# Altium footprint library LukaLIBRARY.PcbLib: 784 footprints (part 44 of 49)
Each footprint in its own frame and in the unit in brackets; x right, y up, seen from the top. Pads: shape width x height; smd on the part's side, far side on the other; paste and mask are expansions set on the pad; w line width, h text height; cw(c..) or ccw(c..) is an arc to the next point about the centre after c.
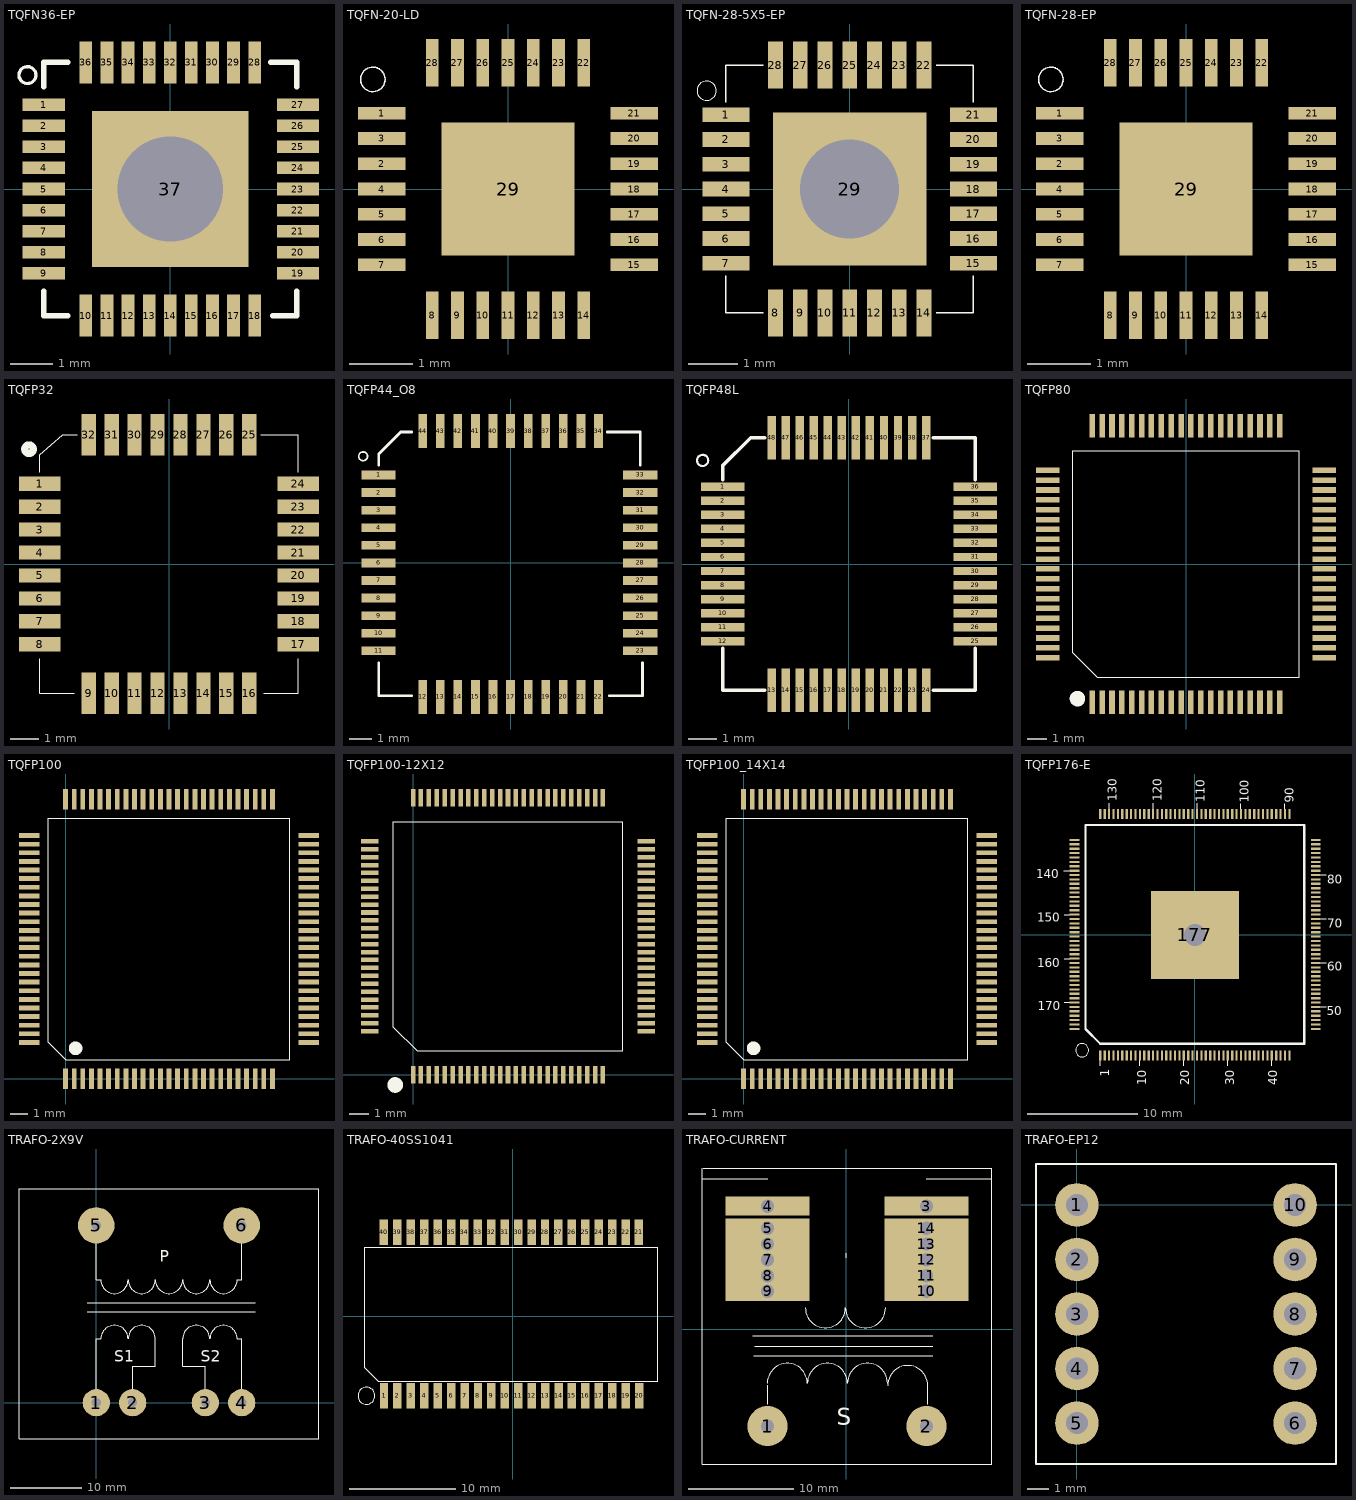
[diagram p43: the footprints below, top view; thin cyan lines are the x and y axes]

## TQFN36-EP [mm]
pads (37):
  rect 1x0.3 smd mask-25.4: 1(-3,2) 2(-3,1.5) 3(-3,1) 4(-3,0.5) 5(-3,0) 6(-3,-0.5) 7(-3,-1) 8(-3,-1.5) 9(-3,-2) 19(3.025,-2) 20(3.025,-1.5) 21(3.025,-1) 22(3.025,-0.5) 23(3.025,0) 24(3.025,0.5) 25(3.025,1) 26(3.025,1.5) 27(3.025,2)
  rect 0.3x1 smd mask-25.4: 10(-2,-3) 11(-1.5,-3) 12(-1,-3) 13(-0.5,-3) 14(0,-3) 15(0.5,-3) 16(1,-3) 17(1.5,-3) 18(2,-3) 28(2,3) 29(1.5,3) 30(1,3) 31(0.5,3) 32(0,3) 33(-0.5,3) 34(-1,3) 35(-1.5,3) 36(-2,3)
  rect 3.7x3.7 hole 2.5 unplated mask-25.4: 37(0,0)
Top Overlay:
  circle w0.076: c-3.385,2.7 r0.2
  lines w0.127: -3,-3 -2.425,-3 ; -3,-2.975 -3,-2.425 ; -3,2.425 -3,3 ; -2.975,3 -2.425,3 ; 2.375,3 3,3 ; 2.425,-3 2.975,-3 ; 3,-3 3,-2.425 ; 3,2.425 3,2.975
Top Solder:
  region: -1.85,-3.5 -1.85,-2.5 -2.15,-2.5 -2.15,-3.5
  region: -1.35,-3.5 -1.35,-2.5 -1.65,-2.5 -1.65,-3.5
  region: -0.85,-3.5 -0.85,-2.5 -1.15,-2.5 -1.15,-3.5
  region: -0.35,-3.5 -0.35,-2.5 -0.65,-2.5 -0.65,-3.5
  region: 0.15,-3.5 0.15,-2.5 -0.15,-2.5 -0.15,-3.5
  region: 0.65,-3.5 0.65,-2.5 0.35,-2.5 0.35,-3.5
  region: 1.15,-3.5 1.15,-2.5 0.85,-2.5 0.85,-3.5
  region: 1.65,-3.5 1.65,-2.5 1.35,-2.5 1.35,-3.5
  region: 2.15,-3.5 2.15,-2.5 1.85,-2.5 1.85,-3.5
  region: -3.5,0.35 -2.5,0.35 -2.5,0.65 -3.5,0.65
  region: -3.5,-0.15 -2.5,-0.15 -2.5,0.15 -3.5,0.15
  region: -3.5,-0.65 -2.5,-0.65 -2.5,-0.35 -3.5,-0.35
  region: -3.5,-1.15 -2.5,-1.15 -2.5,-0.85 -3.5,-0.85
  region: -3.5,-1.65 -2.5,-1.65 -2.5,-1.35 -3.5,-1.35
  region: -3.5,-2.15 -2.5,-2.15 -2.5,-1.85 -3.5,-1.85
  region: 1.15,2.5 1.15,3.5 0.85,3.5 0.85,2.5
  region: 0.65,2.5 0.65,3.5 0.35,3.5 0.35,2.5
  region: 0.15,2.5 0.15,3.5 -0.15,3.5 -0.15,2.5
  region: -0.35,2.5 -0.35,3.5 -0.65,3.5 -0.65,2.5
  region: -0.85,2.5 -0.85,3.5 -1.15,3.5 -1.15,2.5
  region: -1.35,2.5 -1.35,3.5 -1.65,3.5 -1.65,2.5
  region: -1.85,2.5 -1.85,3.5 -2.15,3.5 -2.15,2.5
  region: 1.65,2.5 1.65,3.5 1.35,3.5 1.35,2.5
  region: 2.15,2.5 2.15,3.5 1.85,3.5 1.85,2.5
  region: -3.5,1.35 -2.5,1.35 -2.5,1.65 -3.5,1.65
  region: -3.5,1.85 -2.5,1.85 -2.5,2.15 -3.5,2.15
  region: 1.85,-1.85 1.85,1.85 -1.85,1.85 -1.85,-1.85
  region: -3.5,0.85 -2.5,0.85 -2.5,1.15 -3.5,1.15
  region: 3.525,-1.35 2.525,-1.35 2.525,-1.65 3.525,-1.65
  region: 3.525,-0.85 2.525,-0.85 2.525,-1.15 3.525,-1.15
  region: 3.525,-0.35 2.525,-0.35 2.525,-0.65 3.525,-0.65
  region: 3.525,0.15 2.525,0.15 2.525,-0.15 3.525,-0.15
  region: 3.525,0.65 2.525,0.65 2.525,0.35 3.525,0.35
  region: 3.525,-1.85 2.525,-1.85 2.525,-2.15 3.525,-2.15
  region: 2.525,1.85 3.525,1.85 3.525,2.15 2.525,2.15
  region: 2.525,1.35 3.525,1.35 3.525,1.65 2.525,1.65
  region: 2.525,0.85 3.525,0.85 3.525,1.15 2.525,1.15
Bottom Solder:
  region: -1.859,0 -1.823,-0.363 -1.717,-0.711 -1.546,-1.033 -1.314,-1.314 -1.033,-1.546 -0.711,-1.717 -0.363,-1.823 0,-1.859 0.363,-1.823 0.711,-1.717 1.033,-1.546 1.314,-1.314 1.546,-1.033 1.717,-0.711 1.823,-0.363 1.859,0 1.823,0.363 1.717,0.711 1.546,1.033 1.314,1.314 1.033,1.546 0.711,1.717 0.363,1.823 0,1.859 -0.363,1.823 -0.711,1.717 -1.033,1.546 -1.314,1.314 -1.546,1.033 -1.717,0.711 -1.823,0.363

## TQFN-20-LD [mm]
pads (29):
  rect 0.75x0.2 smd mask-25.4: 1(-2,1.2) 2(-2,0.4) 3(-2,0.8) 4(-2,0) 5(-2,-0.4) 6(-2,-0.8) 7(-2,-1.2) 15(2,-1.2) 16(2,-0.8) 17(2,-0.4) 18(2,0) 19(2,0.4) 20(2,0.8) 21(2,1.2)
  rect 0.2x0.75 smd mask-25.4: 8(-1.2,-2) 9(-0.8,-2) 10(-0.4,-2) 11(0,-2) 12(0.4,-2) 13(0.8,-2) 14(1.2,-2) 22(1.2,2) 23(0.8,2) 24(0.4,2) 25(0,2) 26(-0.4,2) 27(-0.8,2) 28(-1.2,2)
  rect 2.1x2.1 smd mask-25.4: 29(0,0)
Top Overlay:
  circle w0.025: c-2.14,1.735 r0.194
Top Solder:
  region: -1.05,-1.05 1.05,-1.05 1.05,1.05 -1.05,1.05
  region: 2.375,-0.1 2.375,0.1 1.625,0.1 1.625,-0.1
  region: -1.625,-0.1 -1.625,0.1 -2.375,0.1 -2.375,-0.1
  region: -1.3,1.625 -1.1,1.625 -1.1,2.375 -1.3,2.375
  region: -0.9,1.625 -0.7,1.625 -0.7,2.375 -0.9,2.375
  region: -0.5,1.625 -0.3,1.625 -0.3,2.375 -0.5,2.375
  region: -0.1,1.625 0.1,1.625 0.1,2.375 -0.1,2.375
  region: 0.3,1.625 0.5,1.625 0.5,2.375 0.3,2.375
  region: 0.7,1.625 0.9,1.625 0.9,2.375 0.7,2.375
  region: 1.1,1.625 1.3,1.625 1.3,2.375 1.1,2.375
  region: 2.375,1.1 2.375,1.3 1.625,1.3 1.625,1.1
  region: 2.375,0.7 2.375,0.9 1.625,0.9 1.625,0.7
  region: 2.375,0.3 2.375,0.5 1.625,0.5 1.625,0.3
  region: -1.625,1.1 -1.625,1.3 -2.375,1.3 -2.375,1.1
  region: -1.625,0.7 -1.625,0.9 -2.375,0.9 -2.375,0.7
  region: -1.625,0.3 -1.625,0.5 -2.375,0.5 -2.375,0.3
  region: 2.375,-0.5 2.375,-0.3 1.625,-0.3 1.625,-0.5
  region: 2.375,-0.9 2.375,-0.7 1.625,-0.7 1.625,-0.9
  region: 1.625,-1.1 1.625,-1.3 2.375,-1.3 2.375,-1.1
  region: 1.1,-2.375 1.3,-2.375 1.3,-1.625 1.1,-1.625
  region: 0.7,-2.375 0.9,-2.375 0.9,-1.625 0.7,-1.625
  region: 0.3,-2.375 0.5,-2.375 0.5,-1.625 0.3,-1.625
  region: -0.1,-2.375 0.1,-2.375 0.1,-1.625 -0.1,-1.625
  region: -0.5,-2.375 -0.3,-2.375 -0.3,-1.625 -0.5,-1.625
  region: -0.9,-2.375 -0.7,-2.375 -0.7,-1.625 -0.9,-1.625
  region: -1.3,-2.375 -1.1,-2.375 -1.1,-1.625 -1.3,-1.625
  region: -1.625,-1.3 -1.625,-1.1 -2.375,-1.1 -2.375,-1.3
  region: -2.375,-0.7 -2.375,-0.9 -1.625,-0.9 -1.625,-0.7
  region: -1.625,-0.5 -1.625,-0.3 -2.375,-0.3 -2.375,-0.5

## TQFN-28-5X5-EP [mm]
pads (29):
  rect 0.95x0.3 smd mask-25.4: 1(-2.5,1.5) 2(-2.5,1) 3(-2.5,0.5) 4(-2.5,0) 5(-2.5,-0.5) 6(-2.5,-1) 7(-2.5,-1.5) 15(2.5,-1.5) 16(2.5,-1) 17(2.5,-0.5) 18(2.5,0) 19(2.5,0.5) 20(2.5,1) 21(2.5,1.5)
  rect 0.3x0.95 smd mask-25.4: 8(-1.5,-2.5) 9(-1,-2.5) 10(-0.5,-2.5) 11(0,-2.5) 12(0.5,-2.5) 13(1,-2.5) 14(1.5,-2.5) 22(1.5,2.5) 23(1,2.5) 24(0.5,2.5) 25(0,2.5) 26(-0.5,2.5) 27(-1,2.5) 28(-1.5,2.5)
  rect 3.1x3.1 hole 2 unplated mask-25.4: 29(0,0)
Top Overlay:
  circle w0.025: c-2.89,1.985 r0.194
  lines w0.03: -2.5,-1.75 -2.5,-2.5 -1.75,-2.5 ; -2.5,1.75 -2.5,2.5 -1.75,2.5 ; 1.75,-2.5 2.5,-2.5 2.5,-1.75 ; 1.75,2.5 2.5,2.5 2.5,1.75
Top Solder:
  region: -1.55,-1.55 1.55,-1.55 1.55,1.55 -1.55,1.55
  region: -0.15,2.025 0.15,2.025 0.15,2.975 -0.15,2.975
  region: -0.15,-2.975 0.15,-2.975 0.15,-2.025 -0.15,-2.025
  region: 2.975,-0.15 2.975,0.15 2.025,0.15 2.025,-0.15
  region: -2.025,-0.15 -2.025,0.15 -2.975,0.15 -2.975,-0.15
  region: 2.975,0.35 2.975,0.65 2.025,0.65 2.025,0.35
  region: 2.975,1.35 2.975,1.65 2.025,1.65 2.025,1.35
  region: 2.975,0.85 2.975,1.15 2.025,1.15 2.025,0.85
  region: 0.35,2.025 0.65,2.025 0.65,2.975 0.35,2.975
  region: 0.85,2.025 1.15,2.025 1.15,2.975 0.85,2.975
  region: 1.35,2.025 1.65,2.025 1.65,2.975 1.35,2.975
  region: 2.975,-0.65 2.975,-0.35 2.025,-0.35 2.025,-0.65
  region: 2.975,-1.15 2.975,-0.85 2.025,-0.85 2.025,-1.15
  region: 2.025,-1.35 2.025,-1.65 2.975,-1.65 2.975,-1.35
  region: 0.35,-2.975 0.65,-2.975 0.65,-2.025 0.35,-2.025
  region: 1.35,-2.975 1.65,-2.975 1.65,-2.025 1.35,-2.025
  region: 0.85,-2.975 1.15,-2.975 1.15,-2.025 0.85,-2.025
  region: -2.025,0.85 -2.025,1.15 -2.975,1.15 -2.975,0.85
  region: -2.025,0.35 -2.025,0.65 -2.975,0.65 -2.975,0.35
  region: -2.025,1.35 -2.025,1.65 -2.975,1.65 -2.975,1.35
  region: -1.65,2.025 -1.35,2.025 -1.35,2.975 -1.65,2.975
  region: -1.15,2.025 -0.85,2.025 -0.85,2.975 -1.15,2.975
  region: -0.65,2.025 -0.35,2.025 -0.35,2.975 -0.65,2.975
  region: -2.025,-1.65 -2.025,-1.35 -2.975,-1.35 -2.975,-1.65
  region: -2.975,-0.85 -2.975,-1.15 -2.025,-1.15 -2.025,-0.85
  region: -2.025,-0.65 -2.025,-0.35 -2.975,-0.35 -2.975,-0.65
  region: -0.65,-2.975 -0.35,-2.975 -0.35,-2.025 -0.65,-2.025
  region: -1.15,-2.975 -0.85,-2.975 -0.85,-2.025 -1.15,-2.025
  region: -1.65,-2.975 -1.35,-2.975 -1.35,-2.025 -1.65,-2.025
Bottom Solder:
  region: 0,1.507 -0.294,1.478 -0.577,1.393 -0.837,1.253 -1.066,1.066 -1.253,0.837 -1.393,0.577 -1.478,0.294 -1.507,0 -1.478,-0.294 -1.393,-0.577 -1.253,-0.837 -1.066,-1.066 -0.837,-1.253 -0.577,-1.393 -0.294,-1.478 0,-1.507 0.294,-1.478 0.577,-1.393 0.837,-1.253 1.066,-1.066 1.253,-0.837 1.393,-0.577 1.478,-0.294 1.507,0 1.478,0.294 1.393,0.577 1.253,0.837 1.066,1.066 0.837,1.253 0.577,1.393 0.294,1.478

## TQFN-28-EP [mm]
pads (29):
  rect 0.75x0.2 smd mask-25.4: 1(-2,1.2) 2(-2,0.4) 3(-2,0.8) 4(-2,0) 5(-2,-0.4) 6(-2,-0.8) 7(-2,-1.2) 15(2,-1.2) 16(2,-0.8) 17(2,-0.4) 18(2,0) 19(2,0.4) 20(2,0.8) 21(2,1.2)
  rect 0.2x0.75 smd mask-25.4: 8(-1.2,-2) 9(-0.8,-2) 10(-0.4,-2) 11(0,-2) 12(0.4,-2) 13(0.8,-2) 14(1.2,-2) 22(1.2,2) 23(0.8,2) 24(0.4,2) 25(0,2) 26(-0.4,2) 27(-0.8,2) 28(-1.2,2)
  rect 2.1x2.1 smd mask-25.4: 29(0,0)
Top Overlay:
  circle w0.025: c-2.14,1.735 r0.194
Top Solder:
  region: -1.625,-0.5 -1.625,-0.3 -2.375,-0.3 -2.375,-0.5
  region: -2.375,-0.7 -2.375,-0.9 -1.625,-0.9 -1.625,-0.7
  region: -1.625,-1.3 -1.625,-1.1 -2.375,-1.1 -2.375,-1.3
  region: -1.3,-2.375 -1.1,-2.375 -1.1,-1.625 -1.3,-1.625
  region: -0.9,-2.375 -0.7,-2.375 -0.7,-1.625 -0.9,-1.625
  region: -0.5,-2.375 -0.3,-2.375 -0.3,-1.625 -0.5,-1.625
  region: -0.1,-2.375 0.1,-2.375 0.1,-1.625 -0.1,-1.625
  region: 0.3,-2.375 0.5,-2.375 0.5,-1.625 0.3,-1.625
  region: 0.7,-2.375 0.9,-2.375 0.9,-1.625 0.7,-1.625
  region: 1.1,-2.375 1.3,-2.375 1.3,-1.625 1.1,-1.625
  region: 1.625,-1.1 1.625,-1.3 2.375,-1.3 2.375,-1.1
  region: 2.375,-0.9 2.375,-0.7 1.625,-0.7 1.625,-0.9
  region: 2.375,-0.5 2.375,-0.3 1.625,-0.3 1.625,-0.5
  region: -1.625,0.3 -1.625,0.5 -2.375,0.5 -2.375,0.3
  region: -1.625,0.7 -1.625,0.9 -2.375,0.9 -2.375,0.7
  region: -1.625,1.1 -1.625,1.3 -2.375,1.3 -2.375,1.1
  region: 2.375,0.3 2.375,0.5 1.625,0.5 1.625,0.3
  region: 2.375,0.7 2.375,0.9 1.625,0.9 1.625,0.7
  region: 2.375,1.1 2.375,1.3 1.625,1.3 1.625,1.1
  region: 1.1,1.625 1.3,1.625 1.3,2.375 1.1,2.375
  region: 0.7,1.625 0.9,1.625 0.9,2.375 0.7,2.375
  region: 0.3,1.625 0.5,1.625 0.5,2.375 0.3,2.375
  region: -0.1,1.625 0.1,1.625 0.1,2.375 -0.1,2.375
  region: -0.5,1.625 -0.3,1.625 -0.3,2.375 -0.5,2.375
  region: -0.9,1.625 -0.7,1.625 -0.7,2.375 -0.9,2.375
  region: -1.3,1.625 -1.1,1.625 -1.1,2.375 -1.3,2.375
  region: -1.625,-0.1 -1.625,0.1 -2.375,0.1 -2.375,-0.1
  region: 2.375,-0.1 2.375,0.1 1.625,0.1 1.625,-0.1
  region: -1.05,-1.05 1.05,-1.05 1.05,1.05 -1.05,1.05

## TQFP32 [mm]
pads (32):
  rect 1.45x0.5 smd: 1(-4.5,2.8) 2(-4.5,2) 3(-4.5,1.2) 4(-4.5,0.4) 5(-4.5,-0.4) 6(-4.5,-1.2) 7(-4.5,-2) 8(-4.5,-2.8) 17(4.5,-2.8) 18(4.5,-2) 19(4.5,-1.2) 20(4.5,-0.4) 21(4.5,0.4) 22(4.5,1.2) 23(4.5,2) 24(4.5,2.8)
  rect 0.5x1.45 smd: 9(-2.8,-4.5) 10(-2,-4.5) 11(-1.2,-4.5) 12(-0.4,-4.5) 13(0.4,-4.5) 14(1.2,-4.5) 15(2,-4.5) 16(2.8,-4.5) 25(2.8,4.5) 26(2,4.5) 27(1.2,4.5) 28(0.4,4.5) 29(-0.4,4.5) 30(-1.2,4.5) 31(-2,4.5) 32(-2.8,4.5)
Top Overlay:
  circle w0.25: c-4.875,4 r0.15
  lines w0.03: -4.5,-3.3 -4.5,-4.5 -3.3,-4.5 ; -4.5,3.2 -4.5,3.8 -3.7,4.5 -3.2,4.5 ; 3.2,4.5 4.5,4.5 4.5,3.2 ; 3.3,-4.5 4.5,-4.5 4.5,-3.3

## TQFP44_O8 [mm]
pads (44):
  rect 1.55x0.4 smd mask-25.4: 1(-6,4) 2(-6,3.2) 3(-6,2.4) 4(-6,1.6) 5(-6,0.8) 6(-6,0) 7(-6,-0.8) 8(-6,-1.6) 9(-6,-2.4) 10(-6,-3.2) 11(-6,-4) 23(5.9,-4) 24(5.9,-3.2) 25(5.9,-2.4) 26(5.9,-1.6) 27(5.9,-0.8) 28(5.9,0) 29(5.9,0.8) 30(5.9,1.6) 31(5.9,2.4) 32(5.9,3.2) 33(5.9,4)
  rect 0.4x1.55 smd mask-25.4: 12(-4,-6.1) 13(-3.2,-6.1) 14(-2.4,-6.1) 15(-1.6,-6.1) 16(-0.8,-6.1) 17(0,-6.1) 18(0.8,-6.1) 19(1.6,-6.1) 20(2.4,-6.1) 21(3.2,-6.1) 22(4,-6.1) 34(4,6) 35(3.2,6) 36(2.4,6) 37(1.6,6) 38(0.8,6) 39(0,6) 40(-0.8,6) 41(-1.6,6) 42(-2.4,6) 43(-3.2,6) 44(-4,6)
Top Overlay:
  circle w0.076: c-6.71,4.85 r0.2
  lines w0.127: -6,-4.54 -6,-6.04 -4.5,-6.04 ; -6,4.46 -6,4.96 -5,5.96 -4.5,5.96 ; 4.4,5.96 5.9,5.96 5.9,4.46 ; 4.5,-6.04 6,-6.04 6,-4.54
Top Solder:
  drawing of 44 lines, arcs and shapes, not listed

## TQFP48L [mm]
pads (48):
  rect 1.55x0.3 smd: 1(-4.5,2.75) 2(-4.5,2.25) 3(-4.5,1.75) 4(-4.5,1.25) 5(-4.5,0.75) 6(-4.5,0.25) 7(-4.5,-0.25) 8(-4.5,-0.75) 9(-4.5,-1.25) 10(-4.5,-1.75) 11(-4.5,-2.25) 12(-4.5,-2.75) 25(4.5,-2.75) 26(4.5,-2.25) 27(4.5,-1.75) 28(4.5,-1.25) 29(4.5,-0.75) 30(4.5,-0.25) 31(4.5,0.25) 32(4.5,0.75) 33(4.5,1.25) 34(4.5,1.75) 35(4.5,2.25) 36(4.5,2.75)
  rect 0.3x1.55 smd: 13(-2.75,-4.5) 14(-2.25,-4.5) 15(-1.75,-4.5) 16(-1.25,-4.5) 17(-0.75,-4.5) 18(-0.25,-4.5) 19(0.25,-4.5) 20(0.75,-4.5) 21(1.25,-4.5) 22(1.75,-4.5) 23(2.25,-4.5) 24(2.75,-4.5) 37(2.75,4.5) 38(2.25,4.5) 39(1.75,4.5) 40(1.25,4.5) 41(0.75,4.5) 42(0.25,4.5) 43(-0.25,4.5) 44(-0.75,4.5) 45(-1.25,4.5) 46(-1.75,4.5) 47(-2.25,4.5) 48(-2.75,4.5)
Top Overlay:
  circle w0.076: c-5.21,3.69 r0.2
  lines w0.127: -4.5,-3 -4.5,-4.5 -3,-4.5 ; -4.5,3 -4.5,3.5 -3.5,4.5 -3,4.5 ; 3,-4.5 4.5,-4.5 4.5,-3 ; 3,4.5 4.5,4.5 4.5,3

## TQFP80 [mm]
pads (80):
  rect 0.28x1.2 smd mask-25.4: 1(-4.75,-7) 2(-4.25,-7) 3(-3.75,-7) 4(-3.25,-7) 5(-2.75,-7) 6(-2.25,-7) 7(-1.75,-7) 8(-1.25,-7) 9(-0.75,-7) 10(-0.25,-7) 11(0.25,-7) 12(0.75,-7) 13(1.25,-7) 14(1.75,-7) 15(2.25,-7) 16(2.75,-7) 17(3.25,-7) 18(3.75,-7) 19(4.25,-7) 20(4.75,-7) 41(4.75,7) 42(4.25,7) 43(3.75,7) 44(3.25,7) 45(2.75,7) 46(2.25,7) 47(1.75,7) 48(1.25,7) 49(0.75,7) 50(0.25,7) 51(-0.25,7) 52(-0.75,7) 53(-1.25,7) 54(-1.75,7) 55(-2.25,7) 56(-2.75,7) 57(-3.25,7) 58(-3.75,7) 59(-4.25,7) 60(-4.75,7)
  rect 1.2x0.28 smd mask-25.4: 21(7,-4.75) 22(7,-4.25) 23(7,-3.75) 24(7,-3.25) 25(7,-2.75) 26(7,-2.25) 27(7,-1.75) 28(7,-1.25) 29(7,-0.75) 30(7,-0.25) 31(7,0.25) 32(7,0.75) 33(7,1.25) 34(7,1.75) 35(7,2.25) 36(7,2.75) 37(7,3.25) 38(7,3.75) 39(7,4.25) 40(7,4.75) 61(-7,4.75) 62(-7,4.25) 63(-7,3.75) 64(-7,3.25) 65(-7,2.75) 66(-7,2.25) 67(-7,1.75) 68(-7,1.25) 69(-7,0.75) 70(-7,0.25) 71(-7,-0.25) 72(-7,-0.75) 73(-7,-1.25) 74(-7,-1.75) 75(-7,-2.25) 76(-7,-2.75) 77(-7,-3.25) 78(-7,-3.75) 79(-7,-4.25) 80(-7,-4.75)
Top Overlay:
  circle w0.381: c-5.5,-6.82 r0.203
  lines w0.025: -5.75,-4.5 -4.5,-5.75 5.75,-5.75 5.75,5.75 -5.75,5.75 -5.75,-4.5
Top Solder:
  drawing of 80 lines, arcs and shapes, not listed

## TQFP100 [mm]
pads (100):
  rect 0.28x1.2 smd mask-25.4: 1(0,0) 2(0.5,0) 3(1,0) 4(1.5,0) 5(2,0) 6(2.5,0) 7(3,0) 8(3.5,0) 9(4,0) 10(4.5,0) 11(5,0) 12(5.5,0) 13(6,0) 14(6.5,0) 15(7,0) 16(7.5,0) 17(8,0) 18(8.5,0) 19(9,0) 20(9.5,0) 21(10,0) 22(10.5,0) 23(11,0) 24(11.5,0) 25(12,0) 51(12,16.2) 52(11.5,16.2) 53(11,16.2) 54(10.5,16.2) 55(10,16.2) 56(9.5,16.2) 57(9,16.2) 58(8.5,16.2) 59(8,16.2) 60(7.5,16.2) 61(7,16.2) 62(6.5,16.2) 63(6,16.2) 64(5.5,16.2) 65(5,16.2) 66(4.5,16.2) 67(4,16.2) 68(3.5,16.2) 69(3,16.2) 70(2.5,16.2) 71(2,16.2) 72(1.5,16.2) 73(1,16.2) 74(0.5,16.2) 75(0,16.2)
  rect 1.2x0.28 smd mask-25.4: 26(14.1,2.1) 27(14.1,2.6) 28(14.1,3.1) 29(14.1,3.6) 30(14.1,4.1) 31(14.1,4.6) 32(14.1,5.1) 33(14.1,5.6) 34(14.1,6.1) 35(14.1,6.6) 36(14.1,7.1) 37(14.1,7.6) 38(14.1,8.1) 39(14.1,8.6) 40(14.1,9.1) 41(14.1,9.6) 42(14.1,10.1) 43(14.1,10.6) 44(14.1,11.1) 45(14.1,11.6) 46(14.1,12.1) 47(14.1,12.6) 48(14.1,13.1) 49(14.1,13.6) 50(14.1,14.1) 76(-2.1,14.1) 77(-2.1,13.6) 78(-2.1,13.1) 79(-2.1,12.6) 80(-2.1,12.1) 81(-2.1,11.6) 82(-2.1,11.1) 83(-2.1,10.6) 84(-2.1,10.1) 85(-2.1,9.6) 86(-2.1,9.1) 87(-2.1,8.6) 88(-2.1,8.1) 89(-2.1,7.6) 90(-2.1,7.1) 91(-2.1,6.6) 92(-2.1,6.1) 93(-2.1,5.6) 94(-2.1,5.1) 95(-2.1,4.6) 96(-2.1,4.1) 97(-2.1,3.6) 98(-2.1,3.1) 99(-2.1,2.6) 100(-2.1,2.1)
Top Overlay:
  circle w0.381: c0.58,1.76 r0.203
  lines w0.025: -1,2.1 0,1.1 13,1.1 13,15.1 -1,15.1 -1,2.1
Top Solder:
  drawing of 100 lines, arcs and shapes, not listed

## TQFP100-12X12 [mil]
pads (100):
  rect 9x35 smd mask-1000: 1(0,0) 2(15.75,0) 3(31.5,0) 4(47.24,0) 5(62.99,0) 6(78.74,0) 7(94.49,0) 8(110.24,0) 9(125.98,0) 10(141.73,0) 11(157.48,0) 12(173.23,0) 13(188.98,0) 14(204.72,0) 15(220.47,0) 16(236.22,0) 17(251.97,0) 18(267.72,0) 19(283.46,0) 20(299.21,0) 21(314.96,0) 22(330.71,0) 23(346.46,0) 24(362.2,0) 25(377.95,0) 51(377.95,551.18) 52(362.2,551.18) 53(346.46,551.18) 54(330.71,551.18) 55(314.96,551.18) 56(299.21,551.18) 57(283.46,551.18) 58(267.72,551.18) 59(251.97,551.18) 60(236.22,551.18) 61(220.47,551.18) 62(204.72,551.18) 63(188.98,551.18) 64(173.23,551.18) 65(157.48,551.18) 66(141.73,551.18) 67(125.98,551.18) 68(110.24,551.18) 69(94.49,551.18) 70(78.74,551.18) 71(62.99,551.18) 72(47.24,551.18) 73(31.5,551.18) 74(15.75,551.18) 75(0,551.18)
  rect 35x9 smd mask-1000: 26(464.57,86.61) 27(464.57,102.36) 28(464.57,118.11) 29(464.57,133.86) 30(464.57,149.61) 31(464.57,165.35) 32(464.57,181.1) 33(464.57,196.85) 34(464.57,212.6) 35(464.57,228.35) 36(464.57,244.09) 37(464.57,259.84) 38(464.57,275.59) 39(464.57,291.34) 40(464.57,307.09) 41(464.57,322.83) 42(464.57,338.58) 43(464.57,354.33) 44(464.57,370.08) 45(464.57,385.83) 46(464.57,401.57) 47(464.57,417.32) 48(464.57,433.07) 49(464.57,448.82) 50(464.57,464.57) 76(-86.61,464.57) 77(-86.61,448.82) 78(-86.61,433.07) 79(-86.61,417.32) 80(-86.61,401.57) 81(-86.61,385.83) 82(-86.61,370.08) 83(-86.61,354.33) 84(-86.61,338.58) 85(-86.61,322.83) 86(-86.61,307.09) 87(-86.61,291.34) 88(-86.61,275.59) 89(-86.61,259.84) 90(-86.61,244.09) 91(-86.61,228.35) 92(-86.61,212.6) 93(-86.61,196.85) 94(-86.61,181.1) 95(-86.61,165.35) 96(-86.61,149.61) 97(-86.61,133.86) 98(-86.61,118.11) 99(-86.61,102.36) 100(-86.61,86.61)
Top Overlay:
  circle w15: c-35.43,-20.47 r8
  lines w1: -39.37,94.49 7.87,47.24 417.32,47.24 417.32,503.94 -39.37,503.94 -39.37,94.49
Top Solder:
  drawing of 50 lines, arcs and shapes, not listed

## TQFP100_14X14 [mm]
pads (100):
  rect 0.28x1.2 smd mask-25.4: 1(0,0) 2(0.5,0) 3(1,0) 4(1.5,0) 5(2,0) 6(2.5,0) 7(3,0) 8(3.5,0) 9(4,0) 10(4.5,0) 11(5,0) 12(5.5,0) 13(6,0) 14(6.5,0) 15(7,0) 16(7.5,0) 17(8,0) 18(8.5,0) 19(9,0) 20(9.5,0) 21(10,0) 22(10.5,0) 23(11,0) 24(11.5,0) 25(12,0) 51(12,16.2) 52(11.5,16.2) 53(11,16.2) 54(10.5,16.2) 55(10,16.2) 56(9.5,16.2) 57(9,16.2) 58(8.5,16.2) 59(8,16.2) 60(7.5,16.2) 61(7,16.2) 62(6.5,16.2) 63(6,16.2) 64(5.5,16.2) 65(5,16.2) 66(4.5,16.2) 67(4,16.2) 68(3.5,16.2) 69(3,16.2) 70(2.5,16.2) 71(2,16.2) 72(1.5,16.2) 73(1,16.2) 74(0.5,16.2) 75(0,16.2)
  rect 1.2x0.28 smd mask-25.4: 26(14.1,2.1) 27(14.1,2.6) 28(14.1,3.1) 29(14.1,3.6) 30(14.1,4.1) 31(14.1,4.6) 32(14.1,5.1) 33(14.1,5.6) 34(14.1,6.1) 35(14.1,6.6) 36(14.1,7.1) 37(14.1,7.6) 38(14.1,8.1) 39(14.1,8.6) 40(14.1,9.1) 41(14.1,9.6) 42(14.1,10.1) 43(14.1,10.6) 44(14.1,11.1) 45(14.1,11.6) 46(14.1,12.1) 47(14.1,12.6) 48(14.1,13.1) 49(14.1,13.6) 50(14.1,14.1) 76(-2.1,14.1) 77(-2.1,13.6) 78(-2.1,13.1) 79(-2.1,12.6) 80(-2.1,12.1) 81(-2.1,11.6) 82(-2.1,11.1) 83(-2.1,10.6) 84(-2.1,10.1) 85(-2.1,9.6) 86(-2.1,9.1) 87(-2.1,8.6) 88(-2.1,8.1) 89(-2.1,7.6) 90(-2.1,7.1) 91(-2.1,6.6) 92(-2.1,6.1) 93(-2.1,5.6) 94(-2.1,5.1) 95(-2.1,4.6) 96(-2.1,4.1) 97(-2.1,3.6) 98(-2.1,3.1) 99(-2.1,2.6) 100(-2.1,2.1)
Top Overlay:
  circle w0.381: c0.58,1.76 r0.203
  lines w0.025: -1,2.1 0,1.1 13,1.1 13,15.1 -1,15.1 -1,2.1
Top Solder:
  drawing of 100 lines, arcs and shapes, not listed

## TQFP176-E [mm]
pads (177):
  rect 0.2x0.9 smd: 1(-8.6,-10.96) 2(-8.2,-10.96) 3(-7.8,-10.96) 4(-7.4,-10.96) 5(-7,-10.96) 6(-6.6,-10.96) 7(-6.2,-10.96) 8(-5.8,-10.96) 9(-5.4,-10.96) 10(-5,-10.96) 11(-4.6,-10.96) 12(-4.2,-10.96) 13(-3.8,-10.96) 14(-3.4,-10.96) 15(-3,-10.96) 16(-2.6,-10.96) 17(-2.2,-10.96) 18(-1.8,-10.96) 19(-1.4,-10.96) 20(-1,-10.96) 21(-0.6,-10.96) 22(-0.2,-10.96) 23(0.2,-10.96) 24(0.6,-10.96) 25(1,-10.96) 26(1.4,-10.96) 27(1.8,-10.96) 28(2.2,-10.96) 29(2.6,-10.96) 30(3,-10.96) 31(3.4,-10.96) 32(3.8,-10.96) 33(4.2,-10.96) 34(4.6,-10.96) 35(5,-10.96) 36(5.4,-10.96) 37(5.8,-10.96) 38(6.2,-10.96) 39(6.6,-10.96) 40(7,-10.96) 41(7.4,-10.96) 42(7.8,-10.96) 43(8.2,-10.96) 44(8.6,-10.96) 89(8.6,10.99) 90(8.2,10.99) 91(7.8,10.99) 92(7.4,10.99) 93(7,10.99) 94(6.6,10.99) 95(6.2,10.99) 96(5.8,10.99) 97(5.4,10.99) 98(5,10.99) 99(4.6,10.99) 100(4.2,10.99) 101(3.8,10.99) 102(3.4,10.99) 103(3,10.99) 104(2.6,10.99) 105(2.2,10.99) 106(1.8,10.99) 107(1.4,10.99) 108(1,10.99) 109(0.6,10.99) 110(0.2,10.99) 111(-0.2,10.99) 112(-0.6,10.99) 113(-1,10.99) 114(-1.4,10.99) 115(-1.8,10.99) 116(-2.2,10.99) 117(-2.6,10.99) 118(-3,10.99) 119(-3.4,10.99) 120(-3.8,10.99) 121(-4.2,10.99) 122(-4.6,10.99) 123(-5,10.99) 124(-5.4,10.99) 125(-5.8,10.99) 126(-6.2,10.99) 127(-6.6,10.99) 128(-7,10.99) 129(-7.4,10.99) 130(-7.8,10.99) 131(-8.2,10.99) 132(-8.6,10.99)
  rect 0.9x0.2 smd: 45(11,-8.56) 46(11,-8.16) 47(11,-7.76) 48(11,-7.36) 49(11,-6.96) 50(11,-6.56) 51(11,-6.16) 52(11,-5.76) 53(11,-5.36) 54(11,-4.96) 55(11,-4.56) 56(11,-4.16) 57(11,-3.76) 58(11,-3.36) 59(11,-2.96) 60(11,-2.56) 61(11,-2.16) 62(11,-1.76) 63(11,-1.36) 64(11,-0.96) 65(11,-0.56) 66(11,-0.16) 67(11,0.24) 68(11,0.64) 69(11,1.04) 70(11,1.44) 71(11,1.84) 72(11,2.24) 73(11,2.64) 74(11,3.04) 75(11,3.44) 76(11,3.84) 77(11,4.24) 78(11,4.64) 79(11,5.04) 80(11,5.44) 81(11,5.84) 82(11,6.24) 83(11,6.64) 84(11,7.04) 85(11,7.44) 86(11,7.84) 87(11,8.24) 88(11,8.64) 133(-10.95,8.64) 134(-10.95,8.24) 135(-10.95,7.84) 136(-10.95,7.44) 137(-10.95,7.04) 138(-10.95,6.64) 139(-10.95,6.24) 140(-10.95,5.84) 141(-10.95,5.44) 142(-10.95,5.04) 143(-10.95,4.64) 144(-10.95,4.24) 145(-10.95,3.84) 146(-10.95,3.44) 147(-10.95,3.04) 148(-10.95,2.64) 149(-10.95,2.24) 150(-10.95,1.84) 151(-10.95,1.44) 152(-10.95,1.04) 153(-10.95,0.64) 154(-10.95,0.24) 155(-10.95,-0.16) 156(-10.95,-0.56) 157(-10.95,-0.96) 158(-10.95,-1.36) 159(-10.95,-1.76) 160(-10.95,-2.16) 161(-10.95,-2.56) 162(-10.95,-2.96) 163(-10.95,-3.36) 164(-10.95,-3.76) 165(-10.95,-4.16) 166(-10.95,-4.56) 167(-10.95,-4.96) 168(-10.95,-5.36) 169(-10.95,-5.76) 170(-10.95,-6.16) 171(-10.95,-6.56) 172(-10.95,-6.96) 173(-10.95,-7.36) 174(-10.95,-7.76) 175(-10.95,-8.16) 176(-10.95,-8.56)
  rect 8x8 on Top hole 2 unplated: 177(0,0)
Top Overlay:
  circle w0.1: c-10.25,-10.5 r0.6
  lines w0.1: -11.91,5.84 -11.41,5.84 ; -11.9,-6.15 -11.4,-6.15 ; -11.89,-2.16 -11.39,-2.16 ; -11.89,1.84 -11.39,1.84 ; -8.6,-11.9 -8.6,-11.4 ; -7.8,11.45 -7.8,11.95 ; -5,-11.9 -5,-11.4 ; -3.8,11.45 -3.8,11.95 ; -1,-11.9 -1,-11.4 ; 0.2,11.45 0.2,11.95 ; 3,-11.9 3,-11.4 ; 4.19,11.44 4.19,11.94 ; 7,-11.9 7,-11.4 ; 8.19,11.44 8.19,11.94 ; 11.44,-6.56 11.94,-6.56 ; 11.45,-2.55 11.95,-2.55 ; 11.45,1.45 11.95,1.45 ; 11.45,5.45 11.95,5.45
  lines w0.2: 9.95,-8.91 9.95,9.99 -8.6,9.99 -9.95,9.99 -9.95,-8.56 -8.6,-9.91 9.95,-9.91 9.95,-8.56
  text "170" at -14.3,-6.85 h0.79
  text "160" at -14.35,-2.96 h0.79
  text "140" at -14.45,5.14 h0.79
  text "120" at -3,12.15 h0.79
  text "100" at 4.89,12.04 h0.79
  text "50" at 12,-7.31 h0.79
  text "60" at 12.05,-3.25 h0.79
  text "70" at 12.05,0.65 h0.79
  text "80" at 12.05,4.65 h0.79
  text "150" at -14.35,1.19 h0.79
  text "1" at -7.8,-12.9 h0.79
  text "10" at -4.4,-13.7 h0.79
  text "20" at -0.5,-13.7 h0.79
  text "30" at 3.6,-13.7 h0.79
  text "40" at 7.5,-13.7 h0.79
  text "110" at 0.9,12.05 h0.79
  text "130" at -7.1,12.15 h0.79
  text "90" at 8.99,12.04 h0.79

## TRAFO-2X9V [mm]
pads (6):
  round 3.81 hole 1.27 mask-25.4: 1(0,0) 2(5.08,0) 3(15.24,0) 4(20.32,0)
  round 5.08 hole 1.27 mask-25.4: 5(0,24.765) 6(20.32,24.765)
Top Overlay:
  lines w0.1: -1.27,12.7 22.225,12.7 ; -1.27,13.97 22.225,13.97 ; 0,1.27 0,8.89 0.635,8.89 cw(c2.54,8.89) 4.445,8.89 cw(c6.35,8.89) 8.255,8.89 8.255,5.08 5.08,5.08 5.08,1.27 ; 0,23.495 0,17.145 0.635,17.145 ccw(c2.54,17.145) 4.445,17.145 ccw(c6.35,17.145) 8.255,17.145 ccw(c10.16,17.145) 12.065,17.145 ccw(c13.97,17.145) 15.875,17.145 ccw(c17.78,17.145) 19.685,17.145 20.32,17.145 20.32,23.495 ; 15.24,1.27 15.24,5.08 12.065,5.08 12.065,8.89 cw(c13.97,8.89) 15.875,8.89 cw(c17.78,8.89) 19.685,8.89 20.32,8.89 20.32,1.27 ; -10.795,-5.08 -10.795,29.845 31.115,29.845 31.115,-5.08 -10.795,-5.08
  text "S1" at 2.54,5.715 h1.59
  text "S2" at 14.605,5.715 h1.59
  text "P" at 8.89,19.685 h1.59
Top Solder:
  drawing of 6 lines, arcs and shapes, not listed
Bottom Solder:
  drawing of 6 lines, arcs and shapes, not listed

## TRAFO-40SS1041 [mm]
pads (40):
  rect 0.8x2.4 smd: 1(-12.19,-7.5) 2(-10.92,-7.5) 3(-9.65,-7.5) 4(-8.38,-7.5) 5(-7.11,-7.5) 6(-5.84,-7.5) 7(-4.57,-7.5) 8(-3.3,-7.5) 9(-2.03,-7.5) 10(-0.76,-7.5) 11(0.51,-7.5) 12(1.78,-7.5) 13(3.05,-7.5) 14(4.32,-7.5) 15(5.59,-7.5) 16(6.86,-7.5) 17(8.13,-7.5) 18(9.4,-7.5) 19(10.67,-7.5) 20(11.94,-7.5) 21(11.93,7.95) 22(10.66,7.95) 23(9.39,7.95) 24(8.12,7.95) 25(6.85,7.95) 26(5.58,7.95) 27(4.31,7.95) 28(3.04,7.95) 29(1.77,7.95) 30(0.5,7.95) 31(-0.77,7.95) 32(-2.04,7.95) 33(-3.31,7.95) 34(-4.58,7.95) 35(-5.85,7.95) 36(-7.12,7.95) 37(-8.39,7.95) 38(-9.66,7.95) 39(-10.93,7.95) 40(-12.2,7.95)
Top Overlay:
  circle w0.076: c-13.85,-7.51 r0.8
  lines w0.03: 11.92,-6.14 13.73,-6.14
  lines w0.076: -14.03,-4.85 -12.73,-6.14 ; -14.03,-4.84 -14.03,6.54 ; -14.02,6.54 13.73,6.54 13.73,-6.14 -12.74,-6.14

## TRAFO-CURRENT [mm]
pads (14):
  round 3.81 hole 1.27 mask-25.4: 1(-7.5,-9.2) 2(7.6,-9.2)
  rect 8x1.8 hole 1.27: 3(7.6,11.7) 4(-7.5,11.7) 5(-7.5,9.6) 6(-7.5,8.1) 7(-7.5,6.6) 8(-7.5,5.1) 9(-7.5,3.6) 10(7.6,3.6) 11(7.6,5.1) 12(7.6,6.6) 13(7.6,8.1) 14(7.6,9.6)
Top Overlay:
  lines w0.03: -13.7,14.3 -7.5,14.3 ; -13.7,15.3 -13.7,-12.8 13.8,-12.8 13.8,15.3 -13.6,15.3 ; -8.9,-0.6 8.2,-0.6 ; -8.8,-2.5 8.2,-2.5 ; -8.7,-1.6 8.2,-1.6 ; -4.7,5 -4.7,6 ; 0,6.8 0,7.2 ; 7.6,14.3 13.8,14.3 ; -8.4,3 -4.7,3 -4.7,10.2 -8.4,10.2 -8.4,3 ; 4.7,2.9 4.7,10.2 8.4,10.2 8.4,2.9 4.7,2.9
  lines w0.1: -7.525,-5.145 cw(c-5.62,-5.145) -3.715,-5.145 cw(c-1.81,-5.145) 0.095,-5.145 cw(c2,-5.145) 3.905,-5.145 ; -7.5,-7.1 -7.5,-5.3 ; -3.905,2.045 ccw(c-2,2.045) -0.095,2.045 ccw(c1.81,2.045) 3.715,2.045 ; 3.915,-5.345 cw(c5.82,-5.345) 7.725,-5.345 ; 7.7,-7.1 7.7,-5.3
  text "S" at -0.9,-9.1 h1.59
Top Solder:
  region: -7.5,-7.286 -7.873,-7.323 -8.233,-7.431 -8.563,-7.608 -8.854,-7.846 -9.092,-8.137 -9.269,-8.467 -9.377,-8.827 -9.414,-9.2 -9.377,-9.573 -9.269,-9.933 -9.092,-10.263 -8.854,-10.554 -8.563,-10.792 -8.233,-10.969 -7.873,-11.077 -7.5,-11.114 -7.127,-11.077 -6.767,-10.969 -6.437,-10.792 -6.146,-10.554 -5.908,-10.263 -5.731,-9.933 -5.623,-9.573 -5.586,-9.2 -5.623,-8.827 -5.731,-8.467 -5.908,-8.137 -6.146,-7.846 -6.437,-7.608 -6.767,-7.431 -7.127,-7.323
  region: 7.6,-7.286 7.227,-7.323 6.867,-7.431 6.537,-7.608 6.246,-7.846 6.008,-8.137 5.831,-8.467 5.723,-8.827 5.686,-9.2 5.723,-9.573 5.831,-9.933 6.008,-10.263 6.246,-10.554 6.537,-10.792 6.867,-10.969 7.227,-11.077 7.6,-11.114 7.973,-11.077 8.333,-10.969 8.663,-10.792 8.954,-10.554 9.192,-10.263 9.369,-9.933 9.477,-9.573 9.514,-9.2 9.477,-8.827 9.369,-8.467 9.192,-8.137 8.954,-7.846 8.663,-7.608 8.333,-7.431 7.973,-7.323
Bottom Solder:
  region: -7.5,-7.286 -7.873,-7.323 -8.233,-7.431 -8.563,-7.608 -8.854,-7.846 -9.092,-8.137 -9.269,-8.467 -9.377,-8.827 -9.414,-9.2 -9.377,-9.573 -9.269,-9.933 -9.092,-10.263 -8.854,-10.554 -8.563,-10.792 -8.233,-10.969 -7.873,-11.077 -7.5,-11.114 -7.127,-11.077 -6.767,-10.969 -6.437,-10.792 -6.146,-10.554 -5.908,-10.263 -5.731,-9.933 -5.623,-9.573 -5.586,-9.2 -5.623,-8.827 -5.731,-8.467 -5.908,-8.137 -6.146,-7.846 -6.437,-7.608 -6.767,-7.431 -7.127,-7.323
  region: 7.6,-7.286 7.227,-7.323 6.867,-7.431 6.537,-7.608 6.246,-7.846 6.008,-8.137 5.831,-8.467 5.723,-8.827 5.686,-9.2 5.723,-9.573 5.831,-9.933 6.008,-10.263 6.246,-10.554 6.537,-10.792 6.867,-10.969 7.227,-11.077 7.6,-11.114 7.973,-11.077 8.333,-10.969 8.663,-10.792 8.954,-10.554 9.192,-10.263 9.369,-9.933 9.477,-9.573 9.514,-9.2 9.477,-8.827 9.369,-8.467 9.192,-8.137 8.954,-7.846 8.663,-7.608 8.333,-7.431 7.973,-7.323

## TRAFO-EP12 [mil]
pads (10):
  round 80 hole 40 mask-1000: 1(0,0) 2(0,-100) 3(0,-200) 4(0,-300) 5(0,-400) 6(400,-400) 7(400,-300) 8(400,-200) 9(400,-100) 10(400,0)
Top Overlay:
  lines w3: -75,-475 -75,75 475,75 475,-475 -75,-475
Top Solder:
  drawing of 10 lines, arcs and shapes, not listed
Bottom Solder:
  drawing of 10 lines, arcs and shapes, not listed